# Altium footprint library dcdc_ldo_ref.pcblib: 50 footprints (part 3 of 4)
Each footprint in its own frame and in the unit in brackets; x right, y up, seen from the top. Pads: shape width x height; smd on the part's side, far side on the other; paste and mask are expansions set on the pad; w line width, h text height; cw(c..) or ccw(c..) is an arc to the next point about the centre after c.
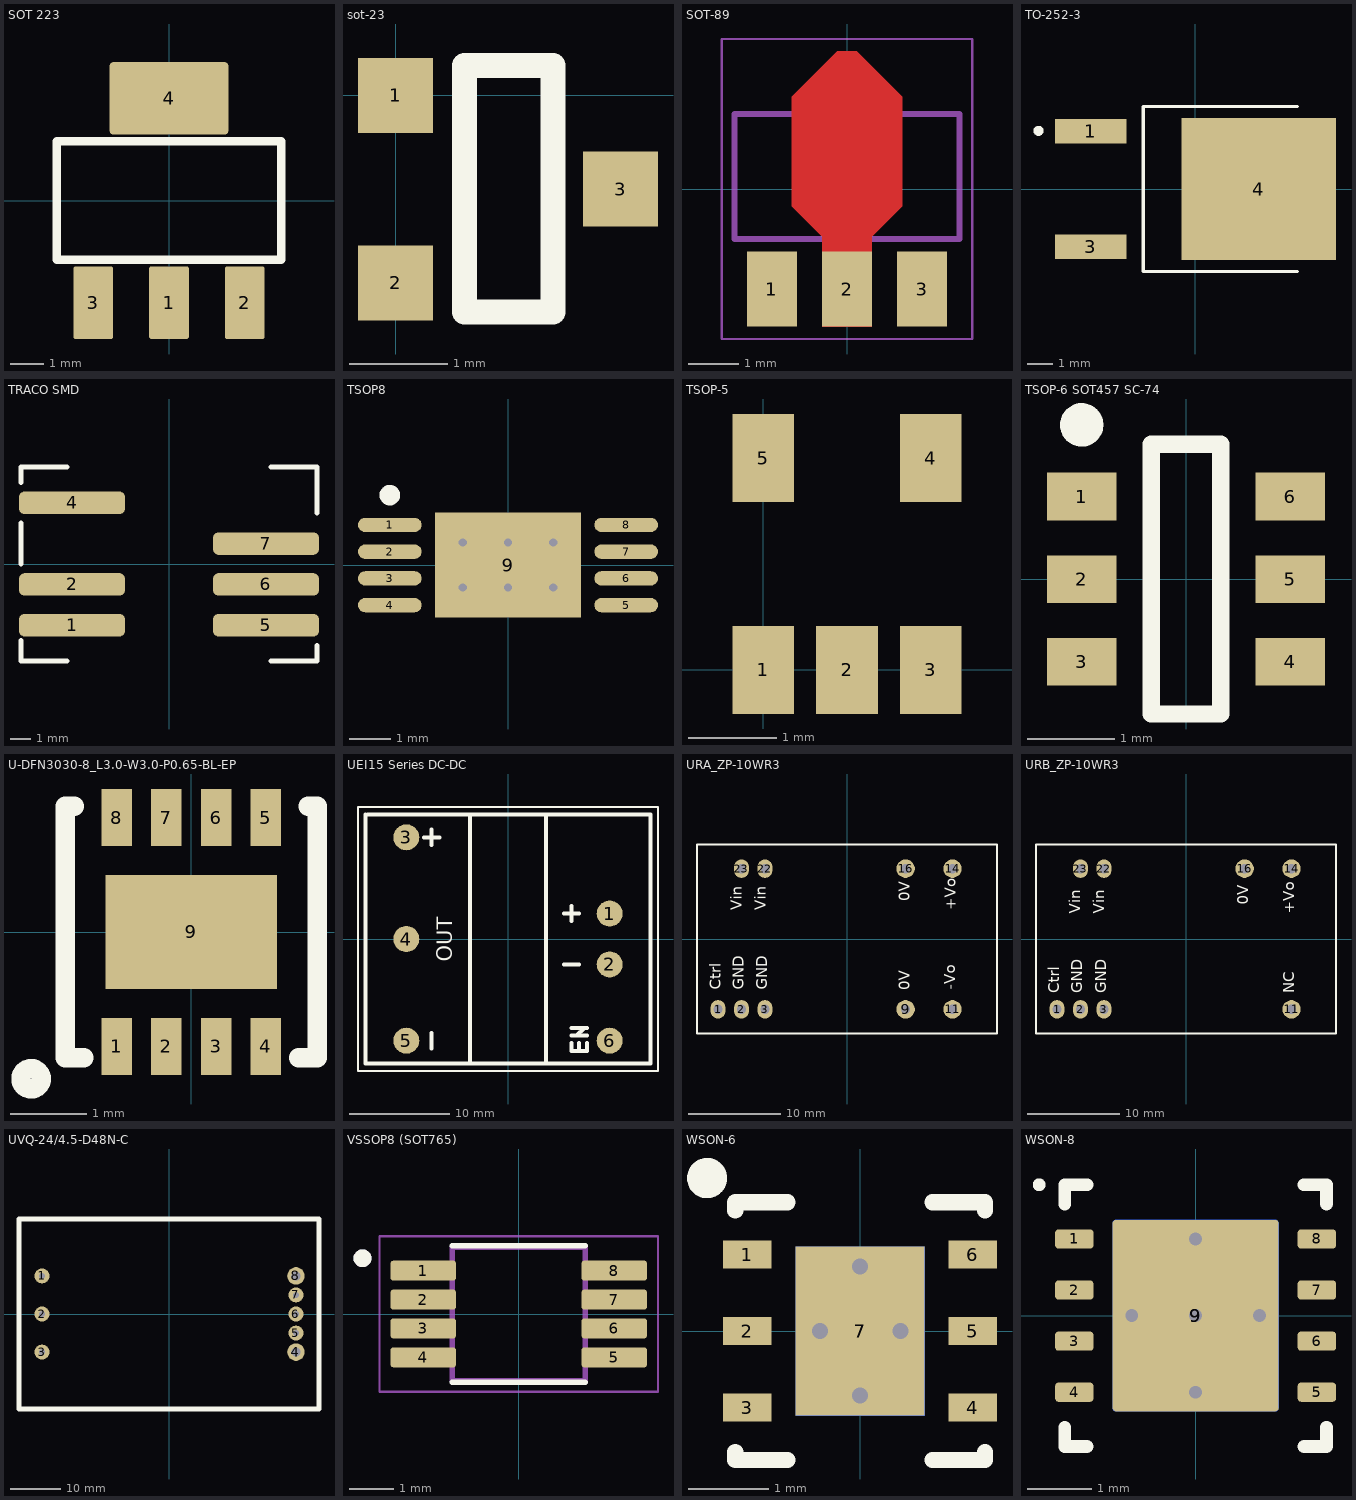
[diagram p2: the footprints below, top view; thin cyan lines are the x and y axes]

## SOT 223 [mm]
pads (4):
  rrect10% 1.2x2.2 smd mask+0: 1(0,-3.1) 2(2.3,-3.1) 3(-2.3,-3.1)
  rrect10% 3.6x2.2 smd mask+0: 4(0,3.1)
Top Overlay:
  lines w0.254: -3.4,-1.8 -3.4,1.8 3.4,1.8 3.4,-1.8 0,-1.8 -3.4,-1.8
3D body "User Library-sot-223.step": height 1.64, standoff -0.04, extent -3.25,-3.466 3.25,3.466

## sot-23 [mil]
pads (3):
  rect 30x30 smd: 1(0,0) 2(0,-75) 3(90,-37.5)
Top Overlay:
  lines w10: 27.56,-86.61 62.99,-86.61 62.99,11.81 27.56,11.81 27.56,-86.61
3D body "SOT-23.step": height 41.34, standoff -1.97, extent -4,-97 94.42,21.11

## SOT-89 [mm]
pads (3):
  rect 1x1.5 smd: 1(-1.5,-2) 3(1.5,-2)
  rect 1x1.5 smd paste-2 mask+0: 2(0,-2)
Top Layer:
  region: 1.1,1.85 1.1,-0.35 0.5,-0.95 0.5,-2.75 -0.5,-2.75 -0.5,-0.95 -1.1,-0.35 -1.1,1.85 -0.2,2.75 0.2,2.75
Top Paste:
  region: 1.1,1.85 1.1,-0.35 0.5,-0.95 0.5,-2.75 -0.5,-2.75 -0.5,-0.95 -1.1,-0.35 -1.1,1.85 -0.2,2.75 0.2,2.75
Top Solder:
  region: 1.2,1.85 1.2,-0.35 0.6,-0.95 0.6,-2.85 -0.6,-2.85 -0.6,-0.95 -1.2,-0.35 -1.2,1.85 -0.2,2.85 0.2,2.85
Plata3D:
  lines w0.127: -2.25,-1 -2.25,1.5 2.25,1.5 2.25,-1 -2.25,-1
Board3D:
  lines w0.05: -2.5,-3 -2.5,3 2.5,3 2.5,-3 -2.5,-3
3D body "step_temp.STEP": height 1.6, standoff 0, extent -2.25,-2.047 2.25,2.047

## TO-252-3 [mm]
pads (3):
  rect 2.83x0.97 smd: 1(-4.14,2.29) 3(-4.14,-2.29)
  rect 6.1x5.63 smd paste-4: 4(2.51,0)
Top Overlay:
  circle w0.2: c-6.2,2.3 r0.1
  lines w0.127: 4.037,-3.26 -2.063,-3.26 -2.063,3.26 4.037,3.26
Top Paste:
  region: 5.21,-2.28 3.89,-2.28 3.89,-0.54 5.21,-0.54
  region: 1.13,-2.28 -0.19,-2.28 -0.19,-0.54 1.13,-0.54
  region: 3.17,-2.28 1.85,-2.28 1.85,-0.54 3.17,-0.54
  region: 5.21,0.54 3.89,0.54 3.89,2.28 5.21,2.28
  region: 1.13,0.54 -0.19,0.54 -0.19,2.28 1.13,2.28
  region: 3.17,0.54 1.85,0.54 1.85,2.28 3.17,2.28
3D body "CircuitWorks-TO-252.step": height 2.3, standoff 0, extent -4.5,-3.29 5.2,3.29

## TRACO SMD [mm]
pads (6):
  rrect50% 5.2x1.1 smd mask+0.05: 1(-4.75,-3) 2(-4.75,-1) 4(-4.75,3) 5(4.75,-3) 6(4.75,-1) 7(4.75,1)
Top Overlay:
  lines w0.254: -7.25,-3.75 -7.25,-4.75 -5,-4.75 ; -7.25,0 -7.25,2 ; -7.25,4 -7.25,4.75 -5,4.75 ; 5,-4.75 7.25,-4.75 7.25,-4 ; 5,4.75 7.25,4.75 7.25,2.5
3D body "tdn1wism.step": height 10.28, standoff 0.13, extent -7.132,-4.565 7.068,4.535

## TSOP8 [mm] "TSOP, 8-Leads, Body 3,00x4,40mm, Pitch 0,65mm, Thermal Pad 2,55.2x3,55.2mm, IPC Medium Density"
height 1.2
pads (9):
  oval 1.55x0.35 smd: 1(-2.875,0.975) 2(-2.875,0.325) 3(-2.875,-0.325) 4(-2.875,-0.975) 5(2.875,-0.975) 6(2.875,-0.325) 7(2.875,0.325) 8(2.875,0.975)
  rect 3.55x2.55 smd: 9(0,0)
via 1.1,-0.55 diameter 0.5 hole 0.2
via 0,-0.55 diameter 0.5 hole 0.2
via -1.1,-0.55 diameter 0.5 hole 0.2
via 1.1,0.55 diameter 0.5 hole 0.2
via 0,0.55 diameter 0.5 hole 0.2
via -1.1,0.55 diameter 0.5 hole 0.2
Top Overlay:
  circle w0.25: c-2.875,1.7 r0.125
3D body "User Library-TSSOP8.STEP": height 1.15, standoff -0.05, extent -3.2,-1.55 3.2,1.55

## TSOP-5 [mm]
pads (5):
  rect 0.7x1 smd: 1(0,0) 2(0.95,0) 3(1.9,0) 4(1.9,2.4) 5(0,2.4)
3D body "sot235.step": height 1, standoff 0, extent -0.51,0.03 2.41,2.37

## TSOP-6 SOT457 SC-74 [mm]
pads (6):
  rect 0.8x0.55 smd paste-0.05: 1(-1.2,0.95) 2(-1.2,0) 3(-1.2,-0.95) 4(1.2,-0.95) 5(1.2,0) 6(1.2,0.95)
Top Overlay:
  circle w0.25: c-1.2,1.775 r0.125
  lines w0.2: -0.4,-1.55 0.4,-1.55 0.4,1.55 -0.4,1.55 -0.4,-1.55
3D body "SOT95P275X110-6L.step": height 1.1, standoff 0, extent -1.5,-1.55 1.5,1.55

## U-DFN3030-8_L3.0-W3.0-P0.65-BL-EP [mm]
pads (9):
  rect 0.4x0.75 smd: 1(-0.975,-1.5) 2(-0.325,-1.5) 3(0.325,-1.5) 4(0.975,-1.5) 5(0.975,1.5) 6(0.325,1.5) 7(-0.325,1.5) 8(-0.975,1.5)
  rect 2.25x1.5 smd: 9(0,0)
Top Overlay:
  circle w0.254: c-2.1,-1.925 r0.133
  lines w0.254: -1.531,1.65 -1.65,1.65 -1.65,-1.65 -1.406,-1.65 ; 1.406,-1.65 1.65,-1.65 1.65,1.65 1.531,1.65
3D body "123.stp": height 0.61, standoff 0, extent -1.51,-1.51 1.51,1.51

## UEI15 Series DC-DC [mm]
pads (6):
  round 2.6 smd: 1(10.16,2.54) 2(10.16,-2.54) 3(-10.16,10.16) 4(-10.16,0) 5(-10.16,-10.16) 6(10.16,-10.16)
Top Overlay:
  lines w0.2: -14.224,12.446 -13.97,12.446 ; -14.986,-13.208 -14.986,-12.954 -14.986,12.7 -14.986,13.208 14.986,13.208 14.986,-13.208 -14.986,-13.208
  lines w0.4: -14.224,12.446 -14.224,-12.446 14.224,-12.446 14.224,12.446 -13.97,12.446 ; -8.382,10.16 -6.858,10.16 ; -7.62,-10.922 -7.62,-9.398 ; -7.62,9.398 -7.62,10.922 ; -3.81,-12.446 -3.81,12.192 ; 3.81,-12.446 3.81,12.446 ; 5.588,-2.54 7.112,-2.54 ; 5.588,2.54 7.112,2.54 ; 6.35,-10.414 6.35,-11.176 7.874,-11.176 7.874,-10.414 ; 6.35,-9.652 6.858,-9.652 ; 6.35,1.778 6.35,3.302 ; 7.112,-11.176 7.112,-10.414 ; 7.874,-9.652 6.858,-9.652 ; 7.874,-8.89 6.35,-8.89 7.62,-8.89 6.858,-9.652
  text "OUT" at -5.588,-2.286 h1.52
3D body "mps_dcdc_uei_15w_smt_a.step": height 8.3, standoff -0.01, extent -13.97,-12.192 13.97,12.192

## URA_ZP-10WR3 [mm] "dc-dc converter"
pads (9):
  oval 1.6x2 hole 1: 1(-13.97,-7.62) 2(-11.43,-7.62) 3(-8.89,-7.62) 22(-8.89,7.62) 23(-11.43,7.62)
  round 2 hole 1: 9(6.35,-7.62) 11(11.43,-7.62) 14(11.43,7.62) 16(6.35,7.62)
Top Overlay:
  lines w0.2: -16.25,-10.25 -16.25,10.25 16.25,10.25 16.25,-10.25 -16.25,-10.25
  text "0V" at 7.223,-5.525 h2
  text "Ctrl" at -13.271,-5.52 h2
  text "GND" at -10.774,-5.52 h2
  text "GND" at -8.18,-5.52 h2
  text "-Vo" at 12.178,-5.522 h2
  text "+Vo" at 12.218,3.105 h2
  text "0V" at 7.225,4.09 h2
  text "Vin" at -8.374,3.105 h2
  text "Vin" at -10.968,3.105 h2
3D body "URA_ZP-10WR3_2.stp": height 10.81, standoff -3.79, extent -16,-10.025 16,10.025

## URB_ZP-10WR3 [mm] "dc-dc converter"
pads (8):
  oval 1.6x2 hole 1: 1(-13.97,-7.62) 2(-11.43,-7.62) 3(-8.89,-7.62) 22(-8.89,7.62) 23(-11.43,7.62)
  round 2 hole 1: 11(11.43,-7.62) 14(11.43,7.62) 16(6.35,7.62)
Top Overlay:
  lines w0.2: -16.25,-10.25 16.25,-10.25 16.25,10.25 -16.25,10.25 -16.25,-10.25
  text "Ctrl" at -13.305,-5.901 h2
  text "GND" at -10.808,-5.901 h2
  text "GND" at -8.214,-5.901 h2
  text "NC" at 12.144,-5.903 h2
  text "+Vo" at 12.183,2.724 h2
  text "0V" at 7.191,3.709 h2
  text "Vin" at -8.408,2.724 h2
  text "Vin" at -11.002,2.724 h2
3D body "URB_ZP-10WR3.stp": height 3.35, standoff -11.25, extent -16,-10.025 16,10.025

## UVQ-24/4.5-D48N-C [mm]
pads (8):
  round 3 hole 1.2 paste-2539.97 mask+0: 1(-25.4,7.62) 2(-25.4,0) 3(-25.4,-7.62) 5(25.4,-3.81) 6(25.4,0) 7(25.4,3.81)
  round 3.5 hole 1.8 paste-2539.97 mask+0: 4(25.4,-7.62) 8(25.4,7.62)
Top Overlay:
  lines w1: -30,-19 -30,19 30,19 30,-19 -30,-19
3D body "uvq_48_2.5_d24_a.step": height 11.27, standoff -5.37, extent -29.22,-18.44 29.2,18.39

## VSSOP8 (SOT765) [mm]
pads (8):
  rrect25% 1.47x0.45 smd: 1(-2.15,0.975) 2(-2.15,0.325) 3(-2.15,-0.325) 4(-2.15,-0.975) 5(2.15,-0.975) 6(2.15,-0.325) 7(2.15,0.325) 8(2.15,0.975)
Top Overlay:
  circle w0.2: c-3.52,1.255 r0.1
  lines w0.127: -1.5,-1.535 1.5,-1.535 ; -1.5,1.535 1.5,1.535
Plata3D:
  circle w0.2: c-3.52,1.255 r0.1
  lines w0.127: -1.5,-1.5 -1.5,1.5 1.5,1.5 1.5,-1.5 -1.5,-1.5
Board3D:
  lines w0.05: -3.135,-1.75 -3.135,1.75 3.135,1.75 3.135,-1.75 -3.135,-1.75
3D body "LM5009AMM_NOPB.STEP": height 1.1, standoff 0, extent -2.45,-1.5 2.45,1.5

## WSON-6 [mm] "TI wson"
pads (8):
  rect 0.6x0.35 smd paste-0.175 mask+0.051: 1(-1.4,0.95) 2(-1.4,0) 3(-1.4,-0.95) 4(1.4,-0.95) 5(1.4,0) 6(1.4,0.95)
  rect 1.6x2.1 smd paste-0.8 mask+0.051: 7(0,0)
  rect 1.6x2.1 smd far side paste-0.8 mask+0.051: 7(0,0)
via 0,-0.8 diameter 0.5 hole 0.2
via 0.5,0 diameter 0.5 hole 0.2
via 0,0.8 diameter 0.5 hole 0.2
via -0.5,0 diameter 0.5 hole 0.2
Top Overlay:
  circle w0.25: c-1.9,1.9 r0.125
  lines w0.2: -1.55,-1.5 -1.55,-1.6 -0.9,-1.6 ; -1.55,1.5 -1.55,1.6 -0.9,1.6 ; 0.9,-1.6 1.55,-1.6 1.55,-1.5 ; 0.9,1.6 1.55,1.6 1.55,1.5
3D body "User Library-WSON-6.step": height 0.75, standoff 0, extent -1.51,-1.49 1.51,1.51

## WSON-8 [mm] "WSON-8"
height 0.8
pads (10):
  rrect33% 0.6x0.3 smd: 1(-1.9,1.2) 2(-1.9,0.4) 3(-1.9,-0.4) 4(-1.9,-1.2) 5(1.9,-1.2) 6(1.9,-0.4) 7(1.9,0.4) 8(1.9,1.2)
  rrect4% 2.6x3 smd paste-1.3: 9(0,0)
  rrect4% 2.6x3 smd far side paste-1.3: 9(0,0)
via 0,-1.2 diameter 0.5 hole 0.2
via 1,0 diameter 0.5 hole 0.2
via 0,0 diameter 0.5 hole 0.2
via -1,0 diameter 0.5 hole 0.2
via 0,1.2 diameter 0.5 hole 0.2
Top Overlay:
  circle w0.1: c-2.45,2.05 r0.05
  lines w0.2: -2.05,-1.75 -2.05,-2.05 -1.7,-2.05 ; -2.05,1.75 -2.05,2.05 -1.7,2.05 ; 1.7,-2.05 2.05,-2.05 2.05,-1.75 ; 1.7,2.05 2.05,2.05 2.05,1.75
Top Paste:
  rectangle: 0.1,0.1 1.248,1.41
  rectangle: -1.248,0.1 -0.1,1.41
  rectangle: -1.248,-1.41 -0.1,-0.1
  rectangle: 0.1,-1.41 1.248,-0.1
3D body "NGT0008A.stp": height 0.81, standoff 0.01, extent -2,-2 2,2